# Altium footprint library Cyberdeck.PcbLib: 261 footprints (part 17 of 17)
Each footprint in its own frame and in the unit in brackets; x right, y up, seen from the top. Pads: shape width x height; smd on the part's side, far side on the other; paste and mask are expansions set on the pad; w line width, h text height; cw(c..) or ccw(c..) is an arc to the next point about the centre after c.
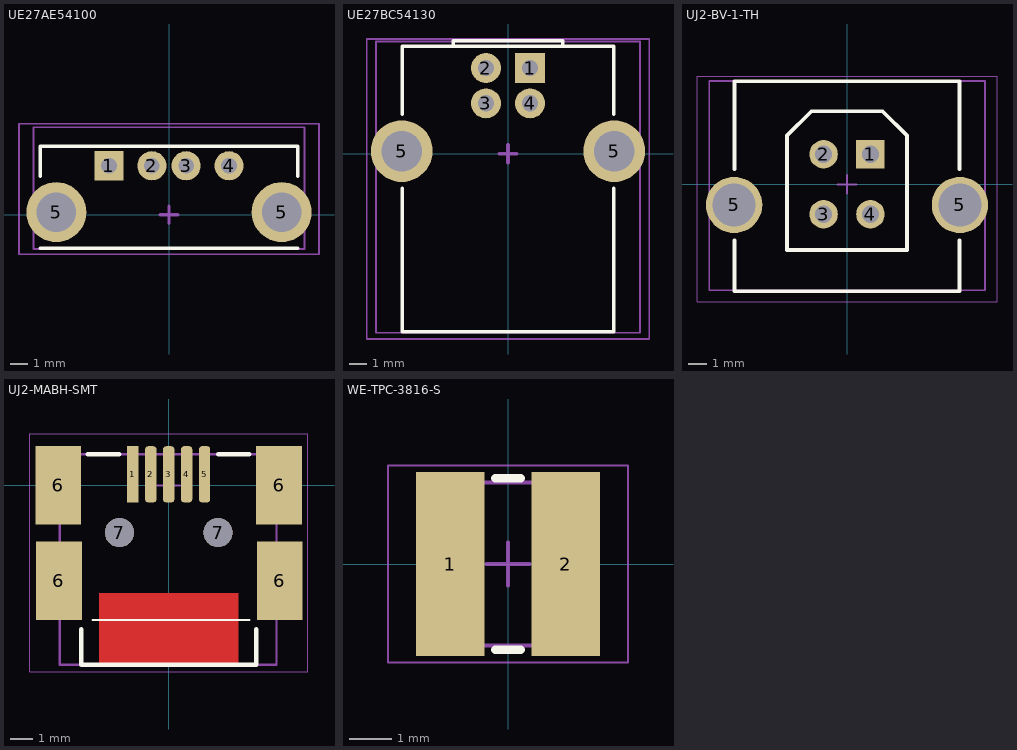
[diagram p16: the footprints below, top view; thin cyan lines are the x and y axes]

## UE27AE54100 [mm] "UE27AE54100"
height 14
pads (6):
  rect 1.7x1.7 hole 0.92: 1(-3.5,2.855)
  round 1.7 hole 0.92: 2(-1,2.855) 3(1,2.855) 4(3.5,2.855)
  round 3.5 hole 2.3: 5(-6.57,0.145) 5(6.57,0.145)
Top Overlay:
  lines w0.2: -7.5,-1.95 7.5,-1.95 ; -7.5,2.25 -7.5,4 7.5,4 7.5,2.25
Assembly Top:
  lines w0.1: -7.9,-2 7.9,-2 7.9,5.1 -7.9,5.1 -7.9,-2
Courtyard Top:
  lines w0.1: -8.75,-2.3 -8.75,5.3 8.75,5.3 8.75,-2.3 -8.75,-2.3
  lines w0.2: -0.5,0 0.5,0 ; 0,-0.5 0,0.5
3D body "1734366-2.stp": height 15.01, standoff -3.92, extent -7.9,-2 7.9,5.12

## UE27BC54130 [mm] "USB RCPT GOLD TYPE B R/A"
height 11.1
pads (6):
  rect 1.7x1.7 hole 0.92: 1(1.25,4.855)
  round 1.7 hole 0.92: 2(-1.25,4.855) 3(-1.25,2.855) 4(1.25,2.855)
  round 3.5 hole 2.3: 5(-6.02,0.145) 5(6.02,0.145)
Top Overlay:
  lines w0.2: -6,-1.95 -6,-10.1 6,-10.1 6,-1.95 ; -6,2.25 -6,6.1 6,6.1 6,2.25 ; -3.1,6.2 -3.1,6.4 3.1,6.4 3.1,6.2
Assembly Top:
  lines w0.1: -7.475,-10.145 -7.475,6.355 7.475,6.355 7.475,-10.145 -7.475,-10.145
Courtyard Top:
  lines w0.1: -8,-10.5 8,-10.5 8,6.5 -8,6.5 -8,-10.5
  lines w0.2: -0.5,0 0.5,0 ; 0,-0.5 0,0.5
3D body "WURTH_61400416121.STEP": height 10.91, standoff -3.3, extent -7.475,-10.145 7.475,6.355

## UJ2-BV-1-TH [mm] "UJ2-BV-1-TH"
height 16
pads (6):
  rect 1.524x1.524 hole 0.92: 1(1.25,1.6)
  round 1.524 hole 0.92: 2(-1.25,1.6) 3(-1.25,-1.6) 4(1.25,-1.6)
  round 3 hole 2.3: 5(-6.02,-1.1) 5(6.02,-1.1)
Top Overlay:
  lines w0.2: -6,-3 -6,-5.7 6,-5.7 6,-3 ; -6,0.8 -6,5.5 6,5.5 6,0.8 ; -3.2,-3.5 3.2,-3.5 3.2,2.6 1.9,3.9 -1.9,3.9 -3.2,2.6 -3.2,-3.5
Assembly Top:
  lines w0.1: -7.349,-5.65 7.35,-5.65 7.35,5.5 -7.349,5.5 -7.349,-5.65
Courtyard Top:
  lines w0.05: -8,-6.25 -8,5.75 8,5.75 8,-6.25 -8,-6.25
  lines w0.1: -0.5,0 0.5,0 ; 0,-0.5 0,0.5
3D body "CUI_UJ2-BV-1-TH.step": height 15.81, standoff -4.19, extent -7.35,-5.65 7.35,5.5

## UJ2-MABH-SMT [mm] "UJ2-MABH-SMT"
height 4
pads (11):
  rect 0.5x2.5 smd: 1(-1.6,0.5)
  rrect50% 0.5x2.5 smd: 2(-0.8,0.5) 3(0,0.5) 4(0.8,0.5) 5(1.6,0.5)
  rect 2.05x3.5 smd: 6(-4.925,0) 6(-4.9,-4.25) 6(4.925,0) 6(4.95,-4.25)
  round 1.3 hole 1.3 unplated: 7(-2.2,-2.1) 7(2.2,-2.1)
Top Layer:
  pour cut-out: -3.1,-4.8 3.1,-4.8 3.1,-8 -3.1,-8
Top Overlay:
  lines w0.1: -3.4,-6 3.6,-6
  lines w0.2: -3.9,-6.4 -3.9,-8 3.9,-8 3.9,-6.4 ; -3.6,1.4 -2.2,1.4 ; 2.2,1.4 3.6,1.4
Assembly Top:
  lines w0.1: -4.86,-7.99 -4.86,1.39 4.8,1.39 4.8,-7.99 -4.86,-7.99
Courtyard Top:
  lines w0.05: -6.2,-8.3 -6.2,2.3 6.2,2.3 6.2,-8.3 -6.2,-8.3
  lines w0.1: -0.5,0 0.5,0 ; 0,-0.5 0,0.5
TopPlacement:
  pour cut-out: -1.4,-9.3
3D body "CUI_UJ2-MABH-1-SMT.step": height 3.97, standoff -0.91, extent -4.83,-7.98 4.83,1.4

## WE-TPC-3816-S [mm] "SMD Inductor, 2-Leads, Body 3.8x3.8x1.8 mm"
height 1.8
pads (2):
  rect 1.6x4.3 smd: 1(-1.35,0) 2(1.35,0)
Top Overlay:
  lines w0.2: -0.3,-2 0.3,-2 ; -0.3,2 0.3,2
Assembly Top:
  lines w0.1: -1.9,-1.9 -1.9,1.9 1.9,1.9 1.9,-1.9 -1.9,-1.9
Courtyard Top:
  lines w0.05: -2.8,-2.3 2.8,-2.3 2.8,2.3 -2.8,2.3 -2.8,-2.3
  lines w0.1: -0.5,0 0.5,0 ; 0,-0.5 0,0.5
3D body "744031470.stp": height 1.64, standoff -0.01, extent -1.9,-1.9 1.9,1.9